# Altium footprint library my Library.PcbLib: 1247 footprints (part 5 of 78)
Each footprint in its own frame and in the unit in brackets; x right, y up, seen from the top. Pads: shape width x height; smd on the part's side, far side on the other; paste and mask are expansions set on the pad; w line width, h text height; cw(c..) or ccw(c..) is an arc to the next point about the centre after c.
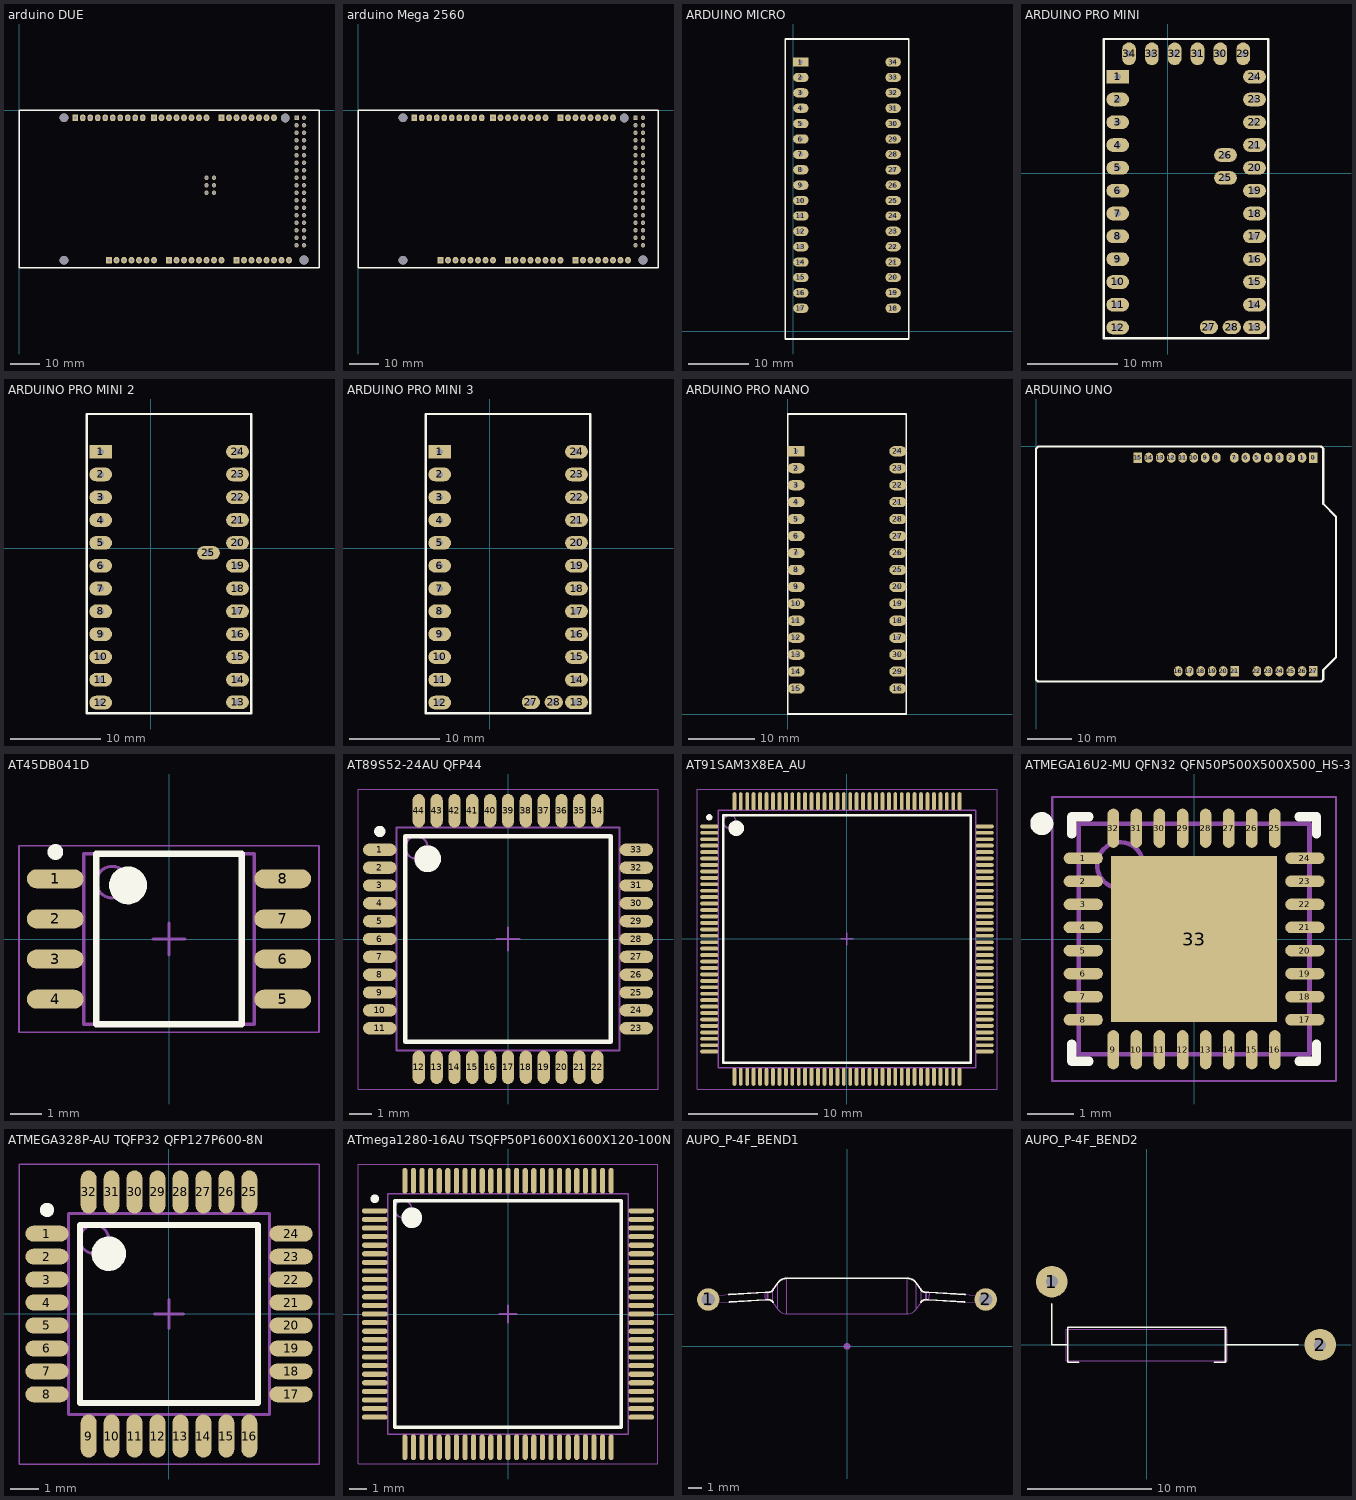
[diagram p4: the footprints below, top view; thin cyan lines are the x and y axes]

## arduino DUE [mil]
pads (91):
  oval 75x90 hole 45: 0(2500,-100) 1(2400,-100) 2(2300,-100) 3(2200,-100) 4(2100,-100) 5(2000,-100) 6(1900,-100) 8(1650,-101) 9(1550,-101) 10(1450,-101) 11(1350,-101) 12(1250,-101) 13(1150,-101) 15(2800,-100) 16(2900,-100) 17(3000,-100) 18(3100,-100) 19(3200,-100) 20(3300,-100) 21(3400,-100) 55(2100,-1999) 56(2200,-1999) 57(2300,-1999) 58(2400,-1999) 59(2500,-1999) 60(2600,-1999) 61(2700,-1999) 63(3000,-1999) 64(3100,-1999) 65(3200,-1999) 66(3300,-1999) 67(3400,-1999) 68(3500,-1999) 69(3600,-1999) 70(850,-101) 81(1800,-1999) 82(1500,-1999) 83(1400,-1999) 84(1700,-1999) 85(1600,-1999) 86(1300,-1999) 87(1050,-101) 88(950,-101)
  rect 75x90 hole 45: 7(1800,-100) 14(2700,-100) 54(2000,-1999) 62(2900,-1999) 71(750,-101) 78(1200,-1999)
  round 60 hole 45: 22(3700,-200) 23(3800,-200) 24(3700,-300) 25(3800,-300) 26(3700,-400) 27(3800,-400) 28(3700,-500) 29(3800,-500) 30(3700,-600) 31(3800,-600) 32(3700,-700) 33(3800,-700) 34(3700,-800) 35(3800,-800) 36(3700,-900) 37(3800,-900) 38(3700,-1000) 39(3800,-1000) 40(3700,-1100) 41(3800,-1100) 42(3700,-1200) 43(3800,-1200) 44(3700,-1300) 45(3800,-1300) 46(3700,-1400) 47(3800,-1400) 48(3700,-1500) 49(3800,-1500) 50(3700,-1600) 51(3800,-1600) 52(3700,-1700) 53(3800,-1700) 73(3800,-100) 74(2500,-900) 75(2600,-1000) 76(2500,-1000) 77(2500,-1100) 79(3700,-1800) 80(3800,-1800) 89(2600,-900) 90(2600,-1100)
  rect 60x60 hole 45: 72(3700,-100)
via 600,-100 diameter 118.11 hole 118.11
via 600,-2000 diameter 118.11 hole 118.11
via 3800,-1998 diameter 118.11 hole 118.11
via 3550,-101 diameter 118.11 hole 118.11
Top Overlay:
  lines w20: 600,0 0,0 ; 750,-101 751,-100 ; 950,-101 951,-100 ; 0,0 4000,0 4000,-2100 0,-2100 0,0
3D body "User Library-ARDUINO DUE.STEP": height -235.43, standoff -810.24, extent -74.01,-2100 4000,0

## arduino Mega 2560 [mil]
pads (86):
  oval 75x90 hole 34: 0(2500,-100) 1(2400,-100) 2(2300,-100) 3(2200,-100) 4(2100,-100) 5(2000,-100) 6(1900,-100) 8(1650,-101) 9(1550,-101) 10(1450,-101) 11(1350,-101) 12(1250,-101) 13(950,-101) 13(1150,-101) 15(2800,-100) 16(2900,-100) 17(3000,-100) 18(3100,-100) 19(3200,-100) 20(3300,-100) 21(3400,-100) 57(2100,-2000) 58(2200,-2000) 59(2300,-2000) 60(2400,-2000) 61(2500,-2000) 62(2600,-2000) 63(2700,-2000) 65(3000,-1999) 66(3100,-1999) 67(3200,-1999) 68(3300,-1999) 69(3400,-1999) 70(3500,-1999) 71(3600,-1999) 72(1800,-1999) 73(1700,-1999) 74(1600,-1999) 75(1300,-1999) 75(1500,-1999) 76(1200,-1999) 76(1400,-1999) 78(850,-101) 78(1050,-101)
  rect 75x90 hole 34: 7(1800,-100) 14(2700,-100) 56(2000,-2000) 64(2900,-1999) 77(1100,-1999) 79(750,-101)
  round 59.06 hole 35.43: 22(3700,-200) 23(3800,-200) 24(3700,-300) 25(3800,-300) 26(3700,-400) 27(3800,-400) 28(3700,-500) 29(3800,-500) 30(3700,-600) 31(3800,-600) 32(3700,-700) 33(3800,-700) 34(3700,-800) 35(3800,-800) 36(3700,-900) 37(3800,-900) 38(3700,-1000) 39(3800,-1000) 40(3700,-1100) 41(3800,-1100) 42(3700,-1200) 43(3800,-1200) 44(3700,-1300) 45(3800,-1300) 46(3700,-1400) 47(3800,-1400) 48(3700,-1500) 49(3800,-1500) 50(3700,-1600) 51(3800,-1600) 52(3700,-1700) 53(3800,-1700) 54(3800,-1800) 55(3700,-1800) ""(3800,-100)
  rect 59.06x59.06 hole 35.43: ""(3700,-100)
via 3550,-101 diameter 118.11 hole 118.11
via 3800,-1998 diameter 118.11 hole 118.11
via 600,-2000 diameter 118.11 hole 118.11
via 600,-100 diameter 118.11 hole 118.11
Top Overlay:
  lines w20: 600,0 0,0 ; 750,-101 751,-100 ; 950,-101 951,-100 ; 0,0 0,-2100 4000,-2100 4000,0 0,0
3D body "User Library-arduino_MEGA2650-1.STEP": height 485.04, standoff -115.35, extent -251,-2099 3999,1

## ARDUINO MICRO [mil]
pads (34):
  rect 100x60 hole 28: 1(50,1750)
  oval 100x60 hole 28: 2(50,1650) 3(50,1550) 4(50,1450) 5(50,1350) 6(50,1250) 7(50,1150) 8(50,1050) 9(50,950) 10(50,850) 11(50,750) 12(50,650) 13(50,550) 14(50,450) 15(50,350) 16(50,250) 17(50,150) 18(650,150) 19(650,250) 20(650,350) 21(650,450) 22(650,550) 23(650,650) 24(650,750) 25(650,850) 26(650,950) 27(650,1050) 28(650,1150) 29(650,1250) 30(650,1350) 31(650,1450) 32(650,1550) 33(650,1650) 34(650,1750)
Top Overlay:
  lines w10: -50,-50 -50,1900 750,1900 750,-50 -50,-50
3D body "User Library-ArduinoMicro.STEP": height 408, standoff -275, extent -1,-40 701,1900

## ARDUINO PRO MINI [mil]
pads (34):
  rect 100x60 hole 28: 1(-218.9,422.6)
  oval 100x60 hole 28: 2(-218.9,322.6) 3(-218.9,222.6) 4(-218.9,122.6) 5(-218.9,22.6) 6(-218.9,-77.4) 7(-218.9,-177.4) 8(-218.9,-277.4) 9(-218.9,-377.4) 10(-218.9,-477.4) 11(-218.9,-577.4) 12(-218.9,-677.4) 13(381.1,-675.6) 14(381.1,-577.4) 15(381.1,-477.4) 16(381.1,-377.4) 17(381.1,-277.4) 18(381.1,-177.4) 19(381.1,-77.4) 20(381.1,22.6) 21(381.1,122.6) 22(381.1,222.6) 23(381.1,322.6) 24(381.1,422.6) 25(253.7,-21.2) 26(253.7,78.8)
  oval 80x60 hole 28: 27(181.1,-675.6) 28(281.1,-675.6)
  oval 60x100 hole 28: 29(331.1,522.6) 30(231.1,522.6) 31(131.1,522.6) 32(31.1,522.6) 33(-68.9,522.6) 34(-168.9,522.6)
Top Overlay:
  lines w10: -280.1,-724.2 441.3,-724.2 441.3,587.6 -280.1,587.6 -280.1,-724.2
3D body "User Library-arduino pro mini.STEP": height -100, standoff -170.87, extent -269.39,-718.8 431.39,580.41

## ARDUINO PRO MINI 2 [mil]
pads (25):
  rect 100x60 hole 28: 1(-218.9,422.6)
  oval 100x60 hole 28: 2(-218.9,322.6) 3(-218.9,222.6) 4(-218.9,122.6) 5(-218.9,22.6) 6(-218.9,-77.4) 7(-218.9,-177.4) 8(-218.9,-277.4) 9(-218.9,-377.4) 10(-218.9,-477.4) 11(-218.9,-577.4) 12(-218.9,-677.4) 13(381.1,-675.6) 14(381.1,-577.4) 15(381.1,-477.4) 16(381.1,-377.4) 17(381.1,-277.4) 18(381.1,-177.4) 19(381.1,-77.4) 20(381.1,22.6) 21(381.1,122.6) 22(381.1,222.6) 23(381.1,322.6) 24(381.1,422.6) 25(253.7,-21.2)
Top Overlay:
  lines w10: -280.1,-724.2 -280.1,587.6 441.3,587.6 441.3,-724.2 -280.1,-724.2
3D body "User Library-arduino pro mini.STEP": height -100, standoff -170.87, extent -269.39,-718.8 431.39,580.41

## ARDUINO PRO MINI 3 [mil]
pads (26):
  rect 100x60 hole 28: 1(-218.9,422.6)
  oval 100x60 hole 28: 2(-218.9,322.6) 3(-218.9,222.6) 4(-218.9,122.6) 5(-218.9,22.6) 6(-218.9,-77.4) 7(-218.9,-177.4) 8(-218.9,-277.4) 9(-218.9,-377.4) 10(-218.9,-477.4) 11(-218.9,-577.4) 12(-218.9,-677.4) 13(381.1,-675.6) 14(381.1,-577.4) 15(381.1,-477.4) 16(381.1,-377.4) 17(381.1,-277.4) 18(381.1,-177.4) 19(381.1,-77.4) 20(381.1,22.6) 21(381.1,122.6) 22(381.1,222.6) 23(381.1,322.6) 24(381.1,422.6)
  oval 80x60 hole 28: 27(181.1,-675.6) 28(281.1,-675.6)
Top Overlay:
  lines w10: -280.1,-724.2 -280.1,587.6 441.3,587.6 441.3,-724.2 -280.1,-724.2
3D body "User Library-arduino pro mini.STEP": height -100, standoff -170.87, extent -269.39,-718.8 431.39,580.41

## ARDUINO PRO NANO [mil]
pads (30):
  rect 100x60 hole 28: 1(50,1550)
  oval 100x60 hole 28: 2(50,1450) 3(50,1350) 4(50,1250) 5(50,1150) 6(50,1050) 7(50,950) 8(50,850) 9(50,750) 10(50,650) 11(50,550) 12(50,450) 13(50,350) 14(50,250) 15(50,150) 16(650,150) 17(650,450) 18(650,550) 19(650,650) 20(650,750) 21(650,1250) 22(650,1350) 23(650,1450) 24(650,1550) 25(650,850) 26(650,950) 27(650,1050) 28(650,1150) 29(650,250) 30(650,350)
Top Overlay:
  lines w10: 0,0 0,1770 700,1770 700,0 0,0
3D body "User Library-arduino_nano.STEP": height 507.64, standoff -224.65, extent -5,-70.83 703.66,1700.83

## ARDUINO UNO [mil]
pads (28):
  rect 75x90 hole 34: 0(2460.63,-100) 15(901,-100) 21(1762,-1995) 27(2460.63,-1995)
  oval 75x90 hole 34: 1(2360.63,-100) 2(2260.63,-100) 3(2160.63,-100) 4(2060.63,-100) 5(1960.63,-100) 6(1860.63,-100) 7(1760.63,-100) 8(1601,-100) 9(1501,-100) 10(1401,-100) 11(1301,-100) 12(1201,-100) 13(1101,-100) 14(1001,-100) 16(1262,-1995) 17(1362,-1995) 18(1462,-1995) 19(1562,-1995) 20(1662,-1995) 22(1960.63,-1995) 23(2060.63,-1995) 24(2160.63,-1995) 25(2260.63,-1995) 26(2360.63,-1995)
Top Overlay:
  lines w20: 0,-2069.61 17,-2086.61 2529.39,-2086.61 2546,-2070 2548.53,-2067.47 2548.53,-1984.53 2662,-1871.06 2662,-622.94 2548.03,-508.97 2548,-508.94 2548,-19 2529,0 20,0 0,-20 0,-2069.61

## AT45DB041D [mm] "SOIC, 8-Leads, Body 5.27x5.30mm, Pitch 1.27mm, IPC Medium Density"
height 2.2
pads (8):
  oval 1.8x0.6 smd: 1(-3.6,1.905) 2(-3.6,0.635) 3(-3.6,-0.635) 4(-3.6,-1.905) 5(3.6,-1.905) 6(3.6,-0.635) 7(3.6,0.635) 8(3.6,1.905)
Top Overlay:
  circle w0.25: c-3.6,2.755 r0.125
  circle w0.6: c-1.3,1.7 r0.3
  lines w0.2: -2.3,-2.7 -2.3,2.7 2.3,2.7 2.3,-2.7 -2.3,-2.7
Mechanical 13:
  circle w0.1: c-1.8,1.8 r0.5
  lines w0.1: -2.7,-2.7 -2.7,2.7 2.7,2.7 2.7,-2.7 -2.7,-2.7
Mechanical 15:
  lines w0.05: -4.75,-2.95 -4.75,2.95 4.75,2.95 4.75,-2.95 -4.75,-2.95
  lines w0.1: -0.5,0 0.5,0 ; 0,-0.5 0,0.5
3D body "AT45DB041D.step": height 2.2, standoff 0, extent -4,-2.7 4,2.7

## AT89S52-24AU QFP44 [mm] "TQFP, 44-Leads, Body 10.00x10.00mm, Pitch 0.80mm, IPC Medium Density"
height 1.5
pads (44):
  oval 1.5x0.55 smd: 1(-5.75,4) 2(-5.75,3.2) 3(-5.75,2.4) 4(-5.75,1.6) 5(-5.75,0.8) 6(-5.75,0) 7(-5.75,-0.8) 8(-5.75,-1.6) 9(-5.75,-2.4) 10(-5.75,-3.2) 11(-5.75,-4) 23(5.75,-4) 24(5.75,-3.2) 25(5.75,-2.4) 26(5.75,-1.6) 27(5.75,-0.8) 28(5.75,0) 29(5.75,0.8) 30(5.75,1.6) 31(5.75,2.4) 32(5.75,3.2) 33(5.75,4)
  oval 0.55x1.5 smd: 12(-4,-5.75) 13(-3.2,-5.75) 14(-2.4,-5.75) 15(-1.6,-5.75) 16(-0.8,-5.75) 17(0,-5.75) 18(0.8,-5.75) 19(1.6,-5.75) 20(2.4,-5.75) 21(3.2,-5.75) 22(4,-5.75) 34(4,5.75) 35(3.2,5.75) 36(2.4,5.75) 37(1.6,5.75) 38(0.8,5.75) 39(0,5.75) 40(-0.8,5.75) 41(-1.6,5.75) 42(-2.4,5.75) 43(-3.2,5.75) 44(-4,5.75)
Top Overlay:
  circle w0.25: c-5.75,4.825 r0.125
  circle w0.6: c-3.6,3.6 r0.3
  lines w0.2: -4.6,-4.6 -4.6,4.6 4.6,4.6 4.6,-4.6 -4.6,-4.6
Mechanical 13:
  circle w0.1: c-4.1,4.1 r0.5
  lines w0.1: -5,-5 -5,5 5,5 5,-5 -5,-5
Mechanical 15:
  lines w0.05: -6.725,-6.725 -6.725,6.725 6.725,6.725 6.725,-6.725 -6.725,-6.725
  lines w0.1: -0.5,0 0.5,0 ; 0,-0.5 0,0.5
3D body "AT89S52-24AU QFP44.step": height 1.5, standoff 0, extent -6,-6 6,6

## AT91SAM3X8EA_AU [mm] "TSQFP, 144-Leads, Body 20.00x20.00mm, Pitch 0.50mm, IPC Medium Density"
height 1.45
pads (144):
  oval 1.4x0.3 smd: 1(-10.7,8.75) 2(-10.7,8.25) 3(-10.7,7.75) 4(-10.7,7.25) 5(-10.7,6.75) 6(-10.7,6.25) 7(-10.7,5.75) 8(-10.7,5.25) 9(-10.7,4.75) 10(-10.7,4.25) 11(-10.7,3.75) 12(-10.7,3.25) 13(-10.7,2.75) 14(-10.7,2.25) 15(-10.7,1.75) 16(-10.7,1.25) 17(-10.7,0.75) 18(-10.7,0.25) 19(-10.7,-0.25) 20(-10.7,-0.75) 21(-10.7,-1.25) 22(-10.7,-1.75) 23(-10.7,-2.25) 24(-10.7,-2.75) 25(-10.7,-3.25) 26(-10.7,-3.75) 27(-10.7,-4.25) 28(-10.7,-4.75) 29(-10.7,-5.25) 30(-10.7,-5.75) 31(-10.7,-6.25) 32(-10.7,-6.75) 33(-10.7,-7.25) 34(-10.7,-7.75) 35(-10.7,-8.25) 36(-10.7,-8.75) 73(10.7,-8.75) 74(10.7,-8.25) 75(10.7,-7.75) 76(10.7,-7.25) 77(10.7,-6.75) 78(10.7,-6.25) 79(10.7,-5.75) 80(10.7,-5.25) 81(10.7,-4.75) 82(10.7,-4.25) 83(10.7,-3.75) 84(10.7,-3.25) 85(10.7,-2.75) 86(10.7,-2.25) 87(10.7,-1.75) 88(10.7,-1.25) 89(10.7,-0.75) 90(10.7,-0.25) 91(10.7,0.25) 92(10.7,0.75) 93(10.7,1.25) 94(10.7,1.75) 95(10.7,2.25) 96(10.7,2.75) 97(10.7,3.25) 98(10.7,3.75) 99(10.7,4.25) 100(10.7,4.75) 101(10.7,5.25) 102(10.7,5.75) 103(10.7,6.25) 104(10.7,6.75) 105(10.7,7.25) 106(10.7,7.75) 107(10.7,8.25) 108(10.7,8.75)
  oval 0.3x1.4 smd: 37(-8.75,-10.7) 38(-8.25,-10.7) 39(-7.75,-10.7) 40(-7.25,-10.7) 41(-6.75,-10.7) 42(-6.25,-10.7) 43(-5.75,-10.7) 44(-5.25,-10.7) 45(-4.75,-10.7) 46(-4.25,-10.7) 47(-3.75,-10.7) 48(-3.25,-10.7) 49(-2.75,-10.7) 50(-2.25,-10.7) 51(-1.75,-10.7) 52(-1.25,-10.7) 53(-0.75,-10.7) 54(-0.25,-10.7) 55(0.25,-10.7) 56(0.75,-10.7) 57(1.25,-10.7) 58(1.75,-10.7) 59(2.25,-10.7) 60(2.75,-10.7) 61(3.25,-10.7) 62(3.75,-10.7) 63(4.25,-10.7) 64(4.75,-10.7) 65(5.25,-10.7) 66(5.75,-10.7) 67(6.25,-10.7) 68(6.75,-10.7) 69(7.25,-10.7) 70(7.75,-10.7) 71(8.25,-10.7) 72(8.75,-10.7) 109(8.75,10.7) 110(8.25,10.7) 111(7.75,10.7) 112(7.25,10.7) 113(6.75,10.7) 114(6.25,10.7) 115(5.75,10.7) 116(5.25,10.7) 117(4.75,10.7) 118(4.25,10.7) 119(3.75,10.7) 120(3.25,10.7) 121(2.75,10.7) 122(2.25,10.7) 123(1.75,10.7) 124(1.25,10.7) 125(0.75,10.7) 126(0.25,10.7) 127(-0.25,10.7) 128(-0.75,10.7) 129(-1.25,10.7) 130(-1.75,10.7) 131(-2.25,10.7) 132(-2.75,10.7) 133(-3.25,10.7) 134(-3.75,10.7) 135(-4.25,10.7) 136(-4.75,10.7) 137(-5.25,10.7) 138(-5.75,10.7) 139(-6.25,10.7) 140(-6.75,10.7) 141(-7.25,10.7) 142(-7.75,10.7) 143(-8.25,10.7) 144(-8.75,10.7)
Top Overlay:
  circle w0.6: c-8.6,8.6 r0.3
  circle w0.25: c-10.7,9.45 r0.125
  lines w0.2: -9.6,-9.6 9.6,-9.6 9.6,9.6 -9.6,9.6 -9.6,-9.6
Mechanical 13:
  circle w0.1: c-9.1,9.1 r0.5
  lines w0.1: -10,-10 10,-10 10,10 -10,10 -10,-10
Mechanical 15:
  lines w0.05: -11.65,-11.65 11.65,-11.65 11.65,11.65 -11.65,11.65 -11.65,-11.65
  lines w0.1: -0.5,0 0.5,0 ; 0,-0.5 0,0.5
3D body "AT91SAM3X8EA_AU.step": height 1.45, standoff 0, extent -10.9,-10.9 10.9,10.9

## ATMEGA16U2-MU QFN32 QFN50P500X500X500_HS-33N [mm] "QFN, 32-Leads, Body 5.00x5.00mm, Pitch 0.50mm, Thermal Pad 3.60x3.60mm, IPC Medium Density"
height 1
pads (33):
  oval 0.85x0.25 smd: 1(-2.4,1.75) 2(-2.4,1.25) 3(-2.4,0.75) 4(-2.4,0.25) 5(-2.4,-0.25) 6(-2.4,-0.75) 7(-2.4,-1.25) 8(-2.4,-1.75) 17(2.4,-1.75) 18(2.4,-1.25) 19(2.4,-0.75) 20(2.4,-0.25) 21(2.4,0.25) 22(2.4,0.75) 23(2.4,1.25) 24(2.4,1.75)
  oval 0.25x0.85 smd: 9(-1.75,-2.4) 10(-1.25,-2.4) 11(-0.75,-2.4) 12(-0.25,-2.4) 13(0.25,-2.4) 14(0.75,-2.4) 15(1.25,-2.4) 16(1.75,-2.4) 25(1.75,2.4) 26(1.25,2.4) 27(0.75,2.4) 28(0.25,2.4) 29(-0.25,2.4) 30(-0.75,2.4) 31(-1.25,2.4) 32(-1.75,2.4)
  rect 3.6x3.6 smd: 33(0,0)
Top Overlay:
  circle w0.25: c-3.3,2.5 r0.125
  lines w0.2: -2.65,-2.275 -2.65,-2.65 -2.275,-2.65 ; -2.65,2.275 -2.65,2.65 -2.275,2.65 ; 2.275,-2.65 2.65,-2.65 2.65,-2.275 ; 2.275,2.65 2.65,2.65 2.65,2.275
Mechanical 13:
  circle w0.1: c-1.6,1.6 r0.5
  lines w0.1: -2.5,-2.5 -2.5,2.5 2.5,2.5 2.5,-2.5 -2.5,-2.5
Mechanical 15:
  lines w0.05: -3.075,-3.075 -3.075,3.075 3.075,3.075 3.075,-3.075 -3.075,-3.075
  lines w0.1: -0.5,0 0.5,0 ; 0,-0.5 0,0.5
3D body "ATMEGA16U2-MU QFN32 QFN50P500X500X500_HS-33N.step": height 1, standoff 0, extent -2.55,-2.55 2.55,2.55

## ATMEGA328P-AU TQFP32 QFP127P600-8N [mm]
height 1.2
pads (32):
  oval 1.5x0.55 smd: 1(-4.25,2.8) 2(-4.25,2) 3(-4.25,1.2) 4(-4.25,0.4) 5(-4.25,-0.4) 6(-4.25,-1.2) 7(-4.25,-2) 8(-4.25,-2.8) 17(4.25,-2.8) 18(4.25,-2) 19(4.25,-1.2) 20(4.25,-0.4) 21(4.25,0.4) 22(4.25,1.2) 23(4.25,2) 24(4.25,2.8)
  oval 0.55x1.5 smd: 9(-2.8,-4.25) 10(-2,-4.25) 11(-1.2,-4.25) 12(-0.4,-4.25) 13(0.4,-4.25) 14(1.2,-4.25) 15(2,-4.25) 16(2.8,-4.25) 25(2.8,4.25) 26(2,4.25) 27(1.2,4.25) 28(0.4,4.25) 29(-0.4,4.25) 30(-1.2,4.25) 31(-2,4.25) 32(-2.8,4.25)
Top Overlay:
  circle w0.6: c-2.1,2.1 r0.3
  circle w0.25: c-4.25,3.625 r0.125
  lines w0.2: -3.1,-3.1 3.1,-3.1 3.1,3.1 -3.1,3.1 -3.1,-3.1
Mechanical 13:
  circle w0.1: c-2.6,2.6 r0.5
  lines w0.1: -3.5,-3.5 3.5,-3.5 3.5,3.5 -3.5,3.5 -3.5,-3.5
Mechanical 15:
  lines w0.05: -5.225,-5.225 5.225,-5.225 5.225,5.225 -5.225,5.225 -5.225,-5.225
  lines w0.1: -0.5,0 0.5,0 ; 0,-0.5 0,0.5
3D body "ATMEGA328P-AU TQFP32 QFP127P600-8N.step": height 1.2, standoff 0, extent -4.5,-4.5 4.5,4.5

## ATmega1280-16AU TSQFP50P1600X1600X120-100N [mm] "TSQFP, 100-Leads, Body 14.00x14.00mm, Pitch 0.50mm, IPC Medium Density"
height 1.2
pads (100):
  oval 1.5x0.3 smd: 1(-7.75,6) 2(-7.75,5.5) 3(-7.75,5) 4(-7.75,4.5) 5(-7.75,4) 6(-7.75,3.5) 7(-7.75,3) 8(-7.75,2.5) 9(-7.75,2) 10(-7.75,1.5) 11(-7.75,1) 12(-7.75,0.5) 13(-7.75,0) 14(-7.75,-0.5) 15(-7.75,-1) 16(-7.75,-1.5) 17(-7.75,-2) 18(-7.75,-2.5) 19(-7.75,-3) 20(-7.75,-3.5) 21(-7.75,-4) 22(-7.75,-4.5) 23(-7.75,-5) 24(-7.75,-5.5) 25(-7.75,-6) 51(7.75,-6) 52(7.75,-5.5) 53(7.75,-5) 54(7.75,-4.5) 55(7.75,-4) 56(7.75,-3.5) 57(7.75,-3) 58(7.75,-2.5) 59(7.75,-2) 60(7.75,-1.5) 61(7.75,-1) 62(7.75,-0.5) 63(7.75,0) 64(7.75,0.5) 65(7.75,1) 66(7.75,1.5) 67(7.75,2) 68(7.75,2.5) 69(7.75,3) 70(7.75,3.5) 71(7.75,4) 72(7.75,4.5) 73(7.75,5) 74(7.75,5.5) 75(7.75,6)
  oval 0.3x1.5 smd: 26(-6,-7.75) 27(-5.5,-7.75) 28(-5,-7.75) 29(-4.5,-7.75) 30(-4,-7.75) 31(-3.5,-7.75) 32(-3,-7.75) 33(-2.5,-7.75) 34(-2,-7.75) 35(-1.5,-7.75) 36(-1,-7.75) 37(-0.5,-7.75) 38(0,-7.75) 39(0.5,-7.75) 40(1,-7.75) 41(1.5,-7.75) 42(2,-7.75) 43(2.5,-7.75) 44(3,-7.75) 45(3.5,-7.75) 46(4,-7.75) 47(4.5,-7.75) 48(5,-7.75) 49(5.5,-7.75) 50(6,-7.75) 76(6,7.75) 77(5.5,7.75) 78(5,7.75) 79(4.5,7.75) 80(4,7.75) 81(3.5,7.75) 82(3,7.75) 83(2.5,7.75) 84(2,7.75) 85(1.5,7.75) 86(1,7.75) 87(0.5,7.75) 88(0,7.75) 89(-0.5,7.75) 90(-1,7.75) 91(-1.5,7.75) 92(-2,7.75) 93(-2.5,7.75) 94(-3,7.75) 95(-3.5,7.75) 96(-4,7.75) 97(-4.5,7.75) 98(-5,7.75) 99(-5.5,7.75) 100(-6,7.75)
Top Overlay:
  circle w0.6: c-5.6,5.6 r0.3
  circle w0.25: c-7.75,6.7 r0.125
  lines w0.2: -6.6,-6.6 6.6,-6.6 6.6,6.6 -6.6,6.6 -6.6,-6.6
Mechanical 13:
  circle w0.1: c-6.1,6.1 r0.5
  lines w0.1: -7,-7 7,-7 7,7 -7,7 -7,-7
Mechanical 15:
  lines w0.05: -8.725,-8.725 8.725,-8.725 8.725,8.725 -8.725,8.725 -8.725,-8.725
  lines w0.1: -0.5,0 0.5,0 ; 0,-0.5 0,0.5
3D body "ATmega1280-16AU TSQFP50P1600X1600X120-100N.step": height 1.2, standoff 0, extent -8,-8 8,8

## AUPO_P-4F_BEND1 [mil] "Aupo P-4F TCO for positioning on IC legs"
height 100
pads (3):
  round 19.68 on Mech15: 0(0,0)
  round 65 / inner round 65 / far side round 90 hole 38: 1(-400,135) 2(400,135)
Top Overlay:
  lines w5: -339.97,149.43 -235.55,155.67 -232.42,155.8 -230.32,155.83 -226.38,155.83 ccw(c-226.38,171.57) -213.48,162.54 -199.33,182.75 cw(c-173.53,164.69) -173.53,196.18 173.53,196.18 cw(c173.53,164.69) 199.33,182.75 213.48,162.54 ccw(c226.38,171.57) 226.38,155.83 230.32,155.83 233.46,155.77 235.55,155.67 340.26,149.42 ; -338.67,127.82 -234.26,134.06 -232.69,134.13 -230.32,134.17 -226.38,134.17 cw(c-226.38,118.43) -213.48,127.46 ; 213.48,127.46 cw(c226.38,118.43) 226.38,134.17 230.32,134.17 231.91,134.15 234.26,134.06 338.97,127.8
Mechanical 13:
  lines w1.97: -381.43,146.96 ccw(c-360.21,137.38) -380.14,125.34 ; 380.14,125.34 ccw(c367.63,134.29) 382.82,136.67 382.89,139.15 382.84,141.46 382.68,143.49 382.42,145.12 382.08,146.27 381.66,146.87 381.43,146.96 ; -235.55,155.67 ccw(c-214.34,146.09) -234.26,134.06 ; -235.55,155.67 -400.65,145.81 ccw(c-400,135) -399.35,124.19 -234.26,134.06 ; -235.55,155.67 -232.42,155.8 -230.32,155.83 ; -234.26,134.06 -232.69,134.13 -230.32,134.17 ; -230.32,134.17 -230.32,155.83 ; -230.32,134.17 -226.38,134.17 ; -230.32,155.83 -226.38,155.83 ; -226.38,134.17 cw(c-226.38,118.43) -213.48,127.46 ; -226.38,134.17 -226.38,155.83 ; -226.38,155.83 ccw(c-226.38,171.57) -213.48,162.54 ; -213.48,127.46 -213.48,162.54 ; -213.48,127.46 -199.33,107.25 ; -213.48,162.54 -199.33,182.75 ; -199.33,107.25 ccw(c-173.53,125.31) -173.53,93.82 ; -199.33,107.25 -199.33,182.75 ; -199.33,182.75 cw(c-173.53,164.69) -173.53,196.18 ; -173.53,93.82 -173.53,196.18 ; -173.53,93.82 173.53,93.82 ; -173.53,196.18 173.53,196.18 ; 173.53,93.82 ccw(c173.53,125.31) 199.33,107.25 ; 173.53,93.82 173.53,196.18 ; 173.53,196.18 cw(c173.53,164.69) 199.33,182.75 ; 199.33,107.25 199.33,182.75 ; 199.33,107.25 213.48,127.46 ; 199.33,182.75 213.48,162.54 ; 213.48,127.46 cw(c226.38,118.43) 226.38,134.17 ; 213.48,127.46 213.48,162.54 ; 213.48,162.54 ccw(c226.38,171.57) 226.38,155.83 ; 226.38,134.17 226.38,155.83 ; 226.38,134.17 230.32,134.17 ; 226.38,155.83 230.32,155.83 ; 230.32,134.17 230.32,155.83 ; 230.32,134.17 231.91,134.15 234.26,134.06 ; 230.32,155.83 233.46,155.77 235.55,155.67 ; 234.26,134.06 ccw(c221.76,143) 236.94,145.39 237.01,147.87 236.96,150.18 236.8,152.21 236.54,153.84 236.19,154.98 235.77,155.59 235.55,155.67 ; 234.26,134.06 399.35,124.19 ccw(c400,135) 400.65,145.81 235.55,155.67
3D body "TH pad - 20 pin x 90.STEP": height 40, standoff 0, extent -444.64,90.1 -355,179.92
3D body "AUPO P-F Series TCO Bend1.STEP": height 104.36, standoff -98, extent -410.74,93.93 410.83,196.09
3D body "TH pad - 20 pin x 90.STEP": height 40, standoff 0, extent 355.36,90.1 445,179.92

## AUPO_P-4F_BEND2 [mil] "Aupo P-4F TCO for positioning on IC legs"
height 100
pads (2):
  round 100 hole 38: 1(-300,200) 2(550,0)
Top Overlay:
  lines w5: -300,130 -300,0 -250,0 ; -215,-55 -250,-55 -250,55 250,55 250,-55 215,-55 ; 250,0 480,0
Mechanical 13:
  lines w3: -255,-50 -255,49.8 255,49.8 255,-50 -255,-50
3D body: height 55, standoff -95, extent -310,190.02 -290.08,209.98
3D body: height 65, standoff 45.08, extent -309.98,-0.02 -290.02,199.98
3D body: height 65, standoff 45.08, extent -299.5,-9.96 -254.5,10
3D body: height 65, standoff 45.08, extent 250,-9.96 550,10
3D body: height 104.61, standoff 5, extent -255,-50 255,49.8
3D body: height 55, standoff -95, extent 540,-9.98 559.92,9.99
3D body: height 65, standoff 45, extent 540,-9.98 559.9,9.94
3D body: height 65, standoff 45, extent -310,190.02 -290.1,209.94
3D body: height 65, standoff 45, extent -310,-10 -290.1,9.91